# Altium footprint library TYCO THD.PcbLib: 146 footprints (part 4 of 11)
Each footprint in its own frame and in the unit in brackets; x right, y up, seen from the top. Pads: shape width x height; smd on the part's side, far side on the other; paste and mask are expansions set on the pad; w line width, h text height; cw(c..) or ccw(c..) is an arc to the next point about the centre after c.
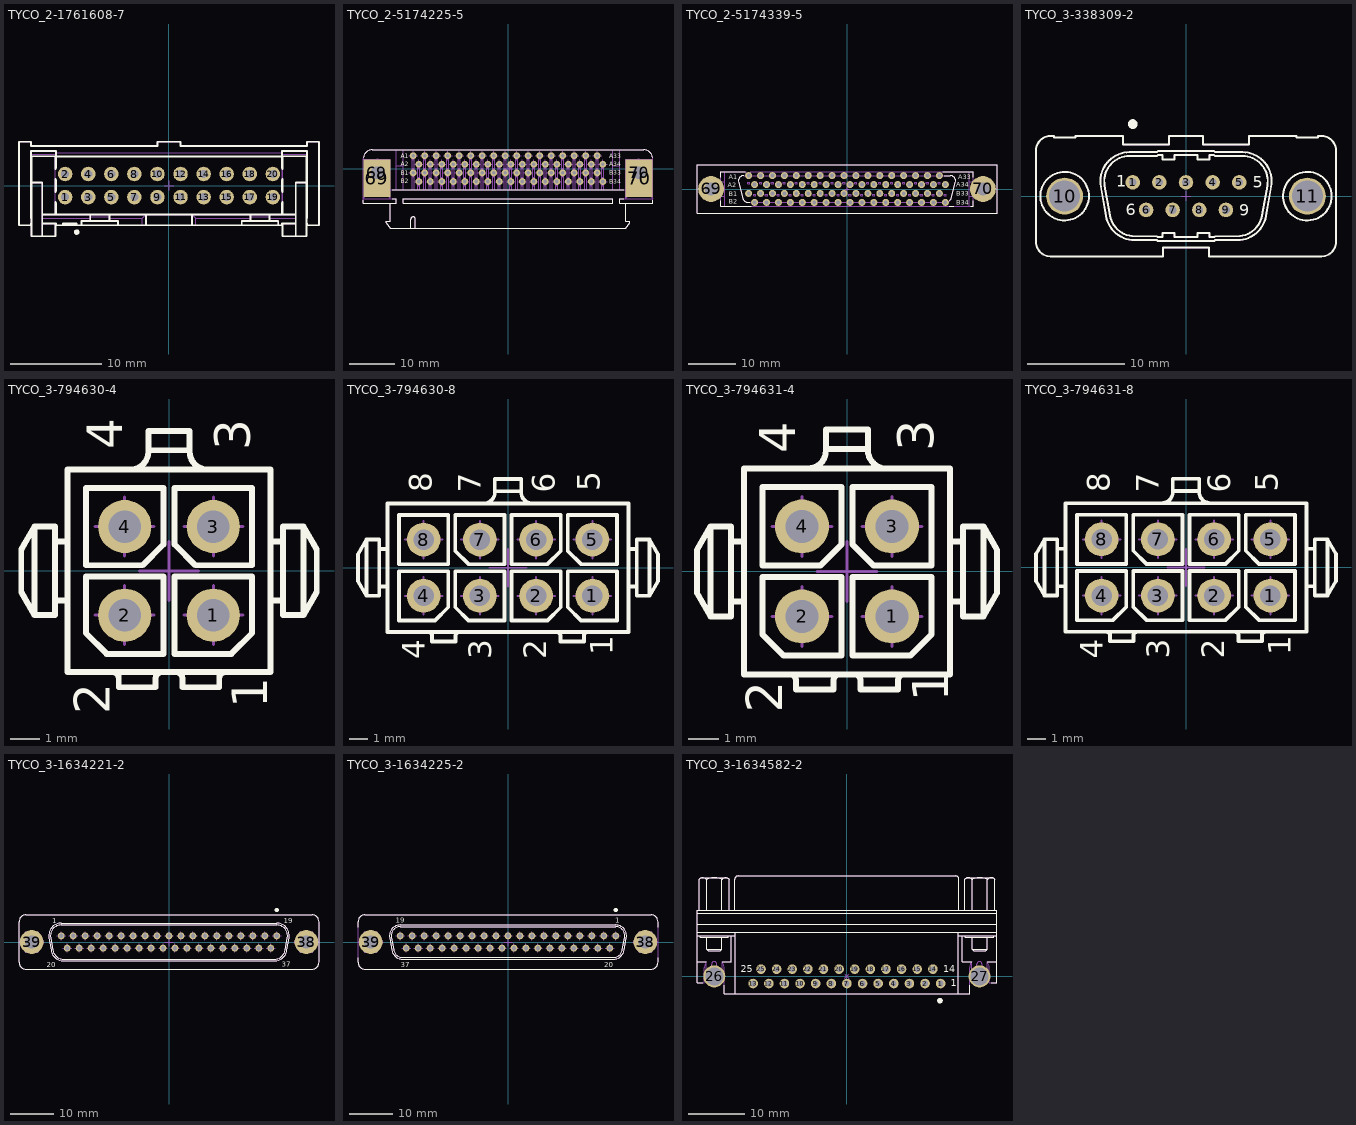
[diagram p3: the footprints below, top view; thin cyan lines are the x and y axes]

## TYCO_2-1761608-7 [mm] "34 Contacts, Vertical Low Profile IDC Shrouded Header, with Short Eject Latch"
height 18.79
pads (20):
  round 1.6 hole 0.9: 1(-11.43,-1.27) 2(-11.43,1.27) 3(-8.89,-1.27) 4(-8.89,1.27) 5(-6.35,-1.27) 6(-6.35,1.27) 7(-3.81,-1.27) 8(-3.81,1.27) 9(-1.27,-1.27) 10(-1.27,1.27) 11(1.27,-1.27) 12(1.27,1.27) 13(3.81,-1.27) 14(3.81,1.27) 15(6.35,-1.27) 16(6.35,1.27) 17(8.89,-1.27) 18(8.89,1.27) 19(11.43,-1.27) 20(11.43,1.27)
Top Overlay:
  circle w0.3: c-10.155,-5.125 r0.15
  lines w0.2: -15.138,-4.191 -15.189,-4.191 -15.189,-4.369 -16.51,-4.369 -16.51,4.826 -15.189,4.826 -15.189,4.369 -1.27,4.369 -1.27,4.826 1.27,4.826 1.27,4.369 15.189,4.369 15.189,4.826 16.51,4.826 16.51,-4.369 15.189,-4.369 15.189,-4.191 15.139,-4.191 ; -15.138,-3.581 -15.189,-3.581 -15.189,3.81 -12.446,3.81 -12.446,1.909 ; -15.138,0.33 -13.944,0.33 -13.944,-5.565 ; -13.944,-4.191 -12.446,-4.191 -12.446,-4.369 -3.81,-4.369 3.81,-4.369 12.446,-4.369 12.446,-4.191 13.945,-4.191 ; -13.944,-3.2 -3.81,-3.2 3.81,-3.2 13.945,-3.2 ; -12.497,-4.191 -12.497,-5.588 -15.138,-5.588 -15.138,3.226 -12.497,3.226 -12.497,1.819 ; -12.497,-3.2 -12.497,-1.819 ; -12.497,-0.721 -12.497,0.721 ; -12.497,3.2 -3.81,3.2 3.81,3.2 12.497,3.2 ; -12.446,-3.2 -12.446,-1.909 ; -12.446,-0.631 -12.446,0.631 ; -11.684,-4.369 -11.684,-4.191 -10.16,-4.191 -10.16,-4.369 ; -10.922,-4.369 -10.922,-4.191 ; -9.626,-4.369 -9.626,-3.886 -5.613,-3.886 -5.613,-4.369 ; -8.674,-3.886 -8.674,-3.2 ; -6.566,-3.886 -6.566,-3.2 ; -2.54,-4.369 -2.54,-3.2 ; 2.54,-4.369 2.54,-3.2 ; 8.014,-4.369 8.014,-3.886 12.027,-3.886 12.027,-4.369 ; 8.966,-3.886 8.966,-3.2 ; 11.075,-3.886 11.075,-3.2 ; 12.446,-3.2 12.446,-1.909 ; 12.446,-0.631 12.446,0.631 ; 12.446,1.909 12.446,3.81 15.189,3.81 15.189,-3.581 15.139,-3.581 ; 12.497,-4.191 12.497,-5.588 15.139,-5.588 15.139,3.226 12.497,3.226 12.497,1.819 ; 12.497,-3.2 12.497,-1.819 ; 12.497,-0.721 12.497,0.721 ; 13.945,-5.565 13.945,0.33 15.139,0.33
Mechanical 8:
  lines w0.1: -11.93,-1.27 -11.43,-1.27 ; -11.93,1.27 -11.43,1.27 ; -11.43,-1.77 -11.43,-1.27 ; -11.43,-0.77 -11.43,-1.27 ; -11.43,0.77 -11.43,1.27 ; -11.43,1.77 -11.43,1.27 ; -10.93,-1.27 -11.43,-1.27 ; -10.93,1.27 -11.43,1.27 ; -9.39,-1.27 -8.89,-1.27 ; -9.39,1.27 -8.89,1.27 ; -8.89,-1.77 -8.89,-1.27 ; -8.89,-0.77 -8.89,-1.27 ; -8.89,0.77 -8.89,1.27 ; -8.89,1.77 -8.89,1.27 ; -8.39,-1.27 -8.89,-1.27 ; -8.39,1.27 -8.89,1.27 ; -6.85,-1.27 -6.35,-1.27 ; -6.85,1.27 -6.35,1.27 ; -6.35,-1.77 -6.35,-1.27 ; -6.35,-0.77 -6.35,-1.27 ; -6.35,0.77 -6.35,1.27 ; -6.35,1.77 -6.35,1.27 ; -5.85,-1.27 -6.35,-1.27 ; -5.85,1.27 -6.35,1.27 ; -4.31,-1.27 -3.81,-1.27 ; -4.31,1.27 -3.81,1.27 ; -3.81,-1.77 -3.81,-1.27 ; -3.81,-0.77 -3.81,-1.27 ; -3.81,0.77 -3.81,1.27 ; -3.81,1.77 -3.81,1.27 ; -3.31,-1.27 -3.81,-1.27 ; -3.31,1.27 -3.81,1.27 ; -1.77,-1.27 -1.27,-1.27 ; -1.77,1.27 -1.27,1.27 ; -1.27,-1.77 -1.27,-1.27 ; -1.27,-0.77 -1.27,-1.27 ; -1.27,0.77 -1.27,1.27 ; -1.27,1.77 -1.27,1.27 ; -0.77,-1.27 -1.27,-1.27 ; -0.77,1.27 -1.27,1.27 ; -0.5,0 0,0 ; 0,-0.5 0,0 ; 0,0.5 0,0 ; 0.5,0 0,0 ; 0.77,-1.27 1.27,-1.27 ; 0.77,1.27 1.27,1.27 ; 1.27,-1.77 1.27,-1.27 ; 1.27,-0.77 1.27,-1.27 ; 1.27,0.77 1.27,1.27 ; 1.27,1.77 1.27,1.27 ; 1.77,-1.27 1.27,-1.27 ; 1.77,1.27 1.27,1.27 ; 3.31,-1.27 3.81,-1.27 ; 3.31,1.27 3.81,1.27 ; 3.81,-1.77 3.81,-1.27 ; 3.81,-0.77 3.81,-1.27 ; 3.81,0.77 3.81,1.27 ; 3.81,1.77 3.81,1.27 ; 4.31,-1.27 3.81,-1.27 ; 4.31,1.27 3.81,1.27 ; 5.85,-1.27 6.35,-1.27 ; 5.85,1.27 6.35,1.27 ; 6.35,-1.77 6.35,-1.27 ; 6.35,-0.77 6.35,-1.27 ; 6.35,0.77 6.35,1.27 ; 6.35,1.77 6.35,1.27 ; 6.85,-1.27 6.35,-1.27 ; 6.85,1.27 6.35,1.27 ; 8.39,-1.27 8.89,-1.27 ; 8.39,1.27 8.89,1.27 ; 8.89,-1.77 8.89,-1.27 ; 8.89,-0.77 8.89,-1.27 ; 8.89,0.77 8.89,1.27 ; 8.89,1.77 8.89,1.27 ; 9.39,-1.27 8.89,-1.27 ; 9.39,1.27 8.89,1.27 ; 10.93,-1.27 11.43,-1.27 ; 10.93,1.27 11.43,1.27 ; 11.43,-1.77 11.43,-1.27 ; 11.43,-0.77 11.43,-1.27 ; 11.43,0.77 11.43,1.27 ; 11.43,1.77 11.43,1.27 ; 11.93,-1.27 11.43,-1.27 ; 11.93,1.27 11.43,1.27
Mechanical 14:
  drawing of 157 lines, arcs and shapes, not listed
3D body "TYCO_2-1761608-7.stp": height 18.79, standoff -2.59, extent -16.51,-5.588 16.51,4.826

## TYCO_2-5174225-5 [mm] "68 contacts, AMPLIMITE .050\", Right Angled Header  Series 2 Type B (Mounting Holes 2.7mm)"
height 9.5
pads (72):
  rect 6x8.355 smd paste-3: 69(-28.955,-2.13) 70(28.955,-2.13)
  round 5.5 hole 2.8: 69(-28.955,-0.953) 70(28.955,-0.953)
  round 1.5 hole 0.8: A1(-20.955,2.858) A2(-19.685,0.953) A3(-18.415,2.858) A4(-17.145,0.953) A5(-15.875,2.858) A6(-14.605,0.953) A7(-13.335,2.858) A8(-12.065,0.952) A9(-10.795,2.858) A10(-9.525,0.953) A11(-8.255,2.858) A12(-6.985,0.953) A13(-5.715,2.858) A14(-4.445,0.953) A15(-3.175,2.858) A16(-1.905,0.953) A17(-0.635,2.858) A18(0.635,0.953) A19(1.905,2.858) A20(3.175,0.953) A21(4.445,2.858) A22(5.715,0.953) A23(6.985,2.858) A24(8.255,0.953) A25(9.525,2.858) A26(10.795,0.953) A27(12.065,2.858) A28(13.335,0.953) A29(14.605,2.858) A30(15.875,0.953) A31(17.145,2.858) A32(18.415,0.953) A33(19.685,2.858) A34(20.955,0.953) B1(-20.955,-0.953) B2(-19.685,-2.858) B3(-18.415,-0.953) B4(-17.145,-2.858) B5(-15.875,-0.953) B6(-14.605,-2.858) B7(-13.335,-0.953) B8(-12.065,-2.858) B9(-10.795,-0.953) B10(-9.525,-2.858) B11(-8.255,-0.953) B12(-6.985,-2.858) B13(-5.715,-0.953) B14(-4.445,-2.858) B15(-3.175,-0.953) B16(-1.905,-2.858) B17(-0.635,-0.953) B18(0.635,-2.858) B19(1.905,-0.953) B20(3.175,-2.858) B21(4.445,-0.953) B22(5.715,-2.858) B23(6.985,-0.953) B24(8.255,-2.858) B25(9.525,-0.953) B26(10.795,-2.858) B27(12.065,-0.953) B28(13.335,-2.858) B29(14.605,-0.953) B30(15.875,-2.858) B31(17.145,-0.953) B32(18.415,-2.858) B33(19.685,-0.953) B34(20.955,-2.858)
Top Overlay:
  lines w0.2: -31.955,-7.007 -31.955,-7.658 -24.69,-7.658 -24.69,-6.658 -25.605,-6.658 ; -31.939,2.398 cw(c-29.955,2.143) -29.955,4.143 29.955,4.143 cw(c29.955,2.143) 31.939,2.398 ; -26.055,-7.658 -26.055,-11.658 -26.855,-11.658 -26.855,-11.957 -26.055,-13.157 26.055,-13.157 26.855,-11.957 26.855,-11.658 26.055,-11.658 26.055,-7.658 ; -25.605,-4.657 25.605,-4.657 ; -21.455,-13.157 -21.455,-11.158 cw(c-20.955,-11.158) -20.455,-11.158 -20.455,-13.157 ; 25.605,-6.658 24.69,-6.658 24.69,-7.658 31.955,-7.658 31.955,-7.007 ; -23.14,-7.658 23.14,-7.658 23.14,-6.658 -23.14,-6.658 -23.14,-7.658
  text "B1" at -23.65,-1.5 h1
  text "A2" at -23.65,0.5 h1
  text "A1" at -23.65,2.25 h1
  text "B2" at -23.65,-3.25 h1
  text "A33" at 22.4,2.335 h1
  text "B34" at 22.4,-3.365 h1
  text "B33" at 22.4,-1.415 h1
  text "A34" at 22.4,0.485 h1
Mechanical 8:
  drawing of 302 lines, arcs and shapes, not listed
Mechanical 14:
  drawing of 174 lines, arcs and shapes, not listed
3D body "TYCO_2-5174225-5.stp": height 9.5, standoff -2.9, extent -31.955,-13.357 31.955,4.143

## TYCO_2-5174339-5 [mm] "68 contacts,AMPLIMITE .050 Series II Connector, Through-hole Vertical Plug"
height 9.3
pads (70):
  round 5.5 hole 2.8: 69(-28.956,0) 70(28.956,0)
  round 1.5 hole 0.8: A1(-20.955,2.858) A2(-19.685,0.953) A3(-18.415,2.858) A4(-17.145,0.953) A5(-15.875,2.858) A6(-14.605,0.953) A7(-13.335,2.858) A8(-12.065,0.952) A9(-10.795,2.858) A10(-9.525,0.953) A11(-8.255,2.858) A12(-6.985,0.953) A13(-5.715,2.858) A14(-4.445,0.953) A15(-3.175,2.858) A16(-1.905,0.953) A17(-0.635,2.858) A18(0.635,0.953) A19(1.905,2.858) A20(3.175,0.953) A21(4.445,2.858) A22(5.715,0.953) A23(6.985,2.858) A24(8.255,0.953) A25(9.525,2.858) A26(10.795,0.953) A27(12.065,2.858) A28(13.335,0.953) A29(14.605,2.858) A30(15.875,0.953) A31(17.145,2.858) A32(18.415,0.953) A33(19.685,2.858) A34(20.955,0.953) B1(-20.955,-0.953) B2(-19.685,-2.858) B3(-18.415,-0.953) B4(-17.145,-2.858) B5(-15.875,-0.953) B6(-14.605,-2.858) B7(-13.335,-0.953) B8(-12.065,-2.858) B9(-10.795,-0.953) B10(-9.525,-2.858) B11(-8.255,-0.953) B12(-6.985,-2.858) B13(-5.715,-0.953) B14(-4.445,-2.858) B15(-3.175,-0.953) B16(-1.905,-2.858) B17(-0.635,-0.953) B18(0.635,-2.858) B19(1.905,-0.953) B20(3.175,-2.858) B21(4.445,-0.953) B22(5.715,-2.858) B23(6.985,-0.953) B24(8.255,-2.858) B25(9.525,-0.953) B26(10.795,-2.858) B27(12.065,-0.953) B28(13.335,-2.858) B29(14.605,-0.953) B30(15.875,-2.858) B31(17.145,-0.953) B32(18.415,-2.858) B33(19.685,-0.953) B34(20.955,-2.858)
Top Overlay:
  lines w0.2: -26.855,-2.475 -26.855,-3.65 -20.365,-3.65 ; -26.855,2.475 -26.855,3.65 -21.635,3.65 ; -22.005,2.85 -22.04,2.85 ccw(c-22.04,1.75) -23.103,1.465 -22.165,-2.035 ccw(c-21.102,-1.75) -21.102,-2.85 -20.735,-2.85 ; 20.365,3.65 26.855,3.65 26.855,2.475 ; 20.735,2.85 22.04,2.85 cw(c22.04,1.75) 23.103,1.465 22.165,-2.035 cw(c21.102,-1.75) 21.932,-2.472 ; 21.825,-3.65 22.7,-3.65 ; 26.325,-3.65 26.855,-3.65 26.855,-2.475 ; -31.955,-5.15 -31.955,5.15 31.955,5.15 31.955,-5.15 -31.955,-5.15
  text "A34" at 23.24,0.502 h1
  text "B33" at 23.24,-1.398 h1
  text "B34" at 23.24,-3.348 h1
  text "A33" at 23.725,2.125 h1
  text "B2" at -25.22,-3.183 h1
  text "A1" at -25.22,2.067 h1
  text "A2" at -25.42,0.367 h1
  text "B1" at -25.22,-1.508 h1
Mechanical 8:
  drawing of 284 lines, arcs and shapes, not listed
Mechanical 14:
  drawing of 302 lines, arcs and shapes, not listed
  text "A34" at 23.24,0.502 h1.02
  text "B33" at 23.24,-1.398 h1.02
  text "B34" at 23.24,-3.348 h1.02
  text "A33" at 23.725,2.125 h1.02
  text "B2" at -25.22,-3.183 h1.02
  text "A1" at -25.22,2.067 h1.02
  text "A2" at -25.42,0.367 h1.02
  text "B1" at -25.22,-1.508 h1.02
3D body "TYCO_2-5174339-5.stp": height 9.3, standoff -3.1, extent -31.955,-5.15 31.955,5.15

## TYCO_3-338309-2 [mm] "Straight D-SUB 9 Male Contacts, Shell Size 1, With Board Lock and Female Screwlocks with Tread 4-40 UNC, HDP-20 Series"
height 11.7
pads (11):
  round 1.5 hole 0.8: 1(-5.486,1.423) 2(-2.743,1.423) 3(0,1.423) 4(2.743,1.423) 5(5.486,1.423) 6(-4.114,-1.423) 7(-1.371,-1.423) 8(1.372,-1.423) 9(4.115,-1.423)
  round 3.8 hole 3.2: 10(-12.495,0) 11(12.495,0)
Top Overlay:
  circle w0.2: c-12.495,0 r2.5
  circle w0.2: c12.495,0 r2.5
  circle w0.5: c-5.48,7.42 r0.25
  lines w0.2: -8.774,1.009 cw(c-5.82,1.53) -5.82,4.53 ; -8.774,1.009 cw(c-5.82,1.53) -5.82,4.53 ; -8.774,1.009 -8.235,-2.051 ; -8.774,1.009 -8.235,-2.051 ; -8.381,1.079 cw(c-5.82,1.53) -5.82,4.13 ; -8.381,1.079 cw(c-5.82,1.53) -5.82,4.13 ; -8.381,1.079 -7.841,-1.981 ; -8.381,1.079 -7.841,-1.981 ; -8.235,-2.051 ccw(c-5.28,-1.53) -5.28,-4.53 ; -8.235,-2.051 ccw(c-5.28,-1.53) -5.28,-4.53 ; -7.841,-1.981 ccw(c-5.28,-1.53) -5.28,-4.13 ; -7.841,-1.981 ccw(c-5.28,-1.53) -5.28,-4.13 ; -5.82,4.13 -3,4.13 ; -5.82,4.13 -3,4.13 ; -5.82,4.53 -3,4.53 ; -5.82,4.53 -3,4.53 ; -5.28,-4.53 -3,-4.53 ; -5.28,-4.53 -3,-4.53 ; -5.28,-4.13 -3,-4.13 ; -5.28,-4.13 -3,-4.13 ; -3,-4.53 -2.9,-4.63 ; -3,-4.53 -2.9,-4.63 ; -3,-4.13 -2.9,-4.23 ; -3,-4.13 -2.9,-4.23 ; -3,4.13 -2.9,4.23 ; -3,4.13 -2.9,4.23 ; -3,4.53 -2.9,4.63 ; -3,4.53 -2.9,4.63 ; -2.9,-4.63 2.9,-4.63 ; -2.9,-4.63 2.9,-4.63 ; -2.9,-4.23 -2.4,-4.23 ; -2.9,-4.23 -2.4,-4.23 ; -2.9,4.23 -2.4,4.23 ; -2.9,4.23 -2.4,4.23 ; -2.9,4.63 2.9,4.63 ; -2.9,4.63 2.9,4.63 ; -2.4,-4.23 -2.4,-3.775 ; -2.4,-4.23 -2.4,-3.775 ; -2.4,-3.775 -1.2,-3.775 ; -2.4,-3.775 -1.2,-3.775 ; -2.4,3.775 -1.2,3.775 ; -2.4,3.775 -2.4,4.23 ; -2.4,3.775 -1.2,3.775 ; -2.4,3.775 -2.4,4.23 ; -1.2,-4.23 -1.2,-3.775 ; -1.2,-4.23 1.2,-4.23 ; -1.2,-4.23 -1.2,-3.775 ; -1.2,-4.23 1.2,-4.23 ; -1.2,3.775 -1.2,4.23 ; -1.2,3.775 -1.2,4.23 ; -1.2,4.23 1.2,4.23 ; -1.2,4.23 1.2,4.23 ; 1.2,-4.23 1.2,-3.775 ; 1.2,-4.23 1.2,-3.775 ; 1.2,-3.775 2.4,-3.775 ; 1.2,-3.775 2.4,-3.775 ; 1.2,3.775 2.4,3.775 ; 1.2,3.775 1.2,4.23 ; 1.2,3.775 2.4,3.775 ; 1.2,3.775 1.2,4.23 ; 2.4,-4.23 2.4,-3.775 ; 2.4,-4.23 2.9,-4.23 ; 2.4,-4.23 2.4,-3.775 ; 2.4,-4.23 2.9,-4.23 ; 2.4,3.775 2.4,4.23 ; 2.4,3.775 2.4,4.23 ; 2.4,4.23 2.9,4.23 ; 2.4,4.23 2.9,4.23 ; 2.9,-4.63 3,-4.53 ; 2.9,-4.63 3,-4.53 ; 2.9,-4.23 3,-4.13 ; 2.9,-4.23 3,-4.13 ; 2.9,4.23 3,4.13 ; 2.9,4.23 3,4.13 ; 2.9,4.63 3,4.53 ; 2.9,4.63 3,4.53 ; 3,-4.53 5.28,-4.53 ; 3,-4.53 5.28,-4.53 ; 3,-4.13 5.28,-4.13 ; 3,-4.13 5.28,-4.13 ; 3,4.13 5.82,4.13 ; 3,4.13 5.82,4.13 ; 3,4.53 5.82,4.53 ; 3,4.53 5.82,4.53 ; 5.28,-4.53 ccw(c5.28,-1.53) 8.235,-2.051 ; 5.28,-4.53 ccw(c5.28,-1.53) 8.235,-2.051 ; 5.28,-4.13 ccw(c5.28,-1.53) 7.841,-1.981 ; 5.28,-4.13 ccw(c5.28,-1.53) 7.841,-1.981 ; 5.82,4.13 cw(c5.82,1.53) 8.381,1.079 ; 5.82,4.13 cw(c5.82,1.53) 8.381,1.079 ; 5.82,4.53 cw(c5.82,1.53) 8.774,1.009 ; 5.82,4.53 cw(c5.82,1.53) 8.774,1.009 ; 7.841,-1.981 8.381,1.079 ; 7.841,-1.981 8.381,1.079 ; 8.235,-2.051 8.774,1.009 ; 8.235,-2.051 8.774,1.009 ; -15.445,-4.7 ccw(c-13.945,-4.7) -13.945,-6.2 -2.375,-6.2 -2.375,-5.3 2.375,-5.3 2.375,-6.2 13.945,-6.2 ccw(c13.945,-4.7) 15.445,-4.7 15.445,4.7 ccw(c13.945,4.7) 13.945,6.2 13.595,6.2 13.595,6.05 11.395,6.05 11.395,6.2 6.485,6.2 6.485,5.3 1.735,5.3 1.735,6.2 -1.735,6.2 -1.735,5.3 -6.485,5.3 -6.485,6.2 -11.395,6.2 -11.395,6.05 -13.595,6.05 -13.595,6.2 -13.945,6.2 ccw(c-13.945,4.7) -15.445,4.7 -15.445,-4.7
  text "6" at -6.21,-1.97 h1.2
  text "5" at 6.855,0.87 h1.2
  text "1" at -7.18,0.945 h1.2
  text "9" at 5.485,-2.02 h1.2
Mechanical 8:
  lines w0.1: -13,0 -12.5,0 ; -12.5,-0.5 -12.5,0 ; -12.5,0.5 -12.5,0 ; -12,0 -12.5,0 ; -5.98,1.42 -5.48,1.42 ; -5.48,0.92 -5.48,1.42 ; -5.48,1.92 -5.48,1.42 ; -4.98,1.42 -5.48,1.42 ; -4.61,-1.42 -4.11,-1.42 ; -4.11,-1.92 -4.11,-1.42 ; -4.11,-0.92 -4.11,-1.42 ; -3.61,-1.42 -4.11,-1.42 ; -3.24,1.42 -2.74,1.42 ; -2.74,0.92 -2.74,1.42 ; -2.74,1.92 -2.74,1.42 ; -2.24,1.42 -2.74,1.42 ; -1.87,-1.42 -1.37,-1.42 ; -1.37,-1.92 -1.37,-1.42 ; -1.37,-0.92 -1.37,-1.42 ; -0.87,-1.42 -1.37,-1.42 ; -0.5,0 0,0 ; -0.5,1.42 0,1.42 ; 0,-0.5 0,0 ; 0,0.5 0,0 ; 0,0.92 0,1.42 ; 0,1.92 0,1.42 ; 0.5,0 0,0 ; 0.5,1.42 0,1.42 ; 0.87,-1.42 1.37,-1.42 ; 1.37,-1.92 1.37,-1.42 ; 1.37,-0.92 1.37,-1.42 ; 1.87,-1.42 1.37,-1.42 ; 2.24,1.42 2.74,1.42 ; 2.74,0.92 2.74,1.42 ; 2.74,1.92 2.74,1.42 ; 3.24,1.42 2.74,1.42 ; 3.61,-1.42 4.11,-1.42 ; 4.11,-1.92 4.11,-1.42 ; 4.11,-0.92 4.11,-1.42 ; 4.61,-1.42 4.11,-1.42 ; 4.98,1.42 5.48,1.42 ; 5.48,0.92 5.48,1.42 ; 5.48,1.92 5.48,1.42 ; 5.98,1.42 5.48,1.42 ; 12,0 12.5,0 ; 12.5,-0.5 12.5,0 ; 12.5,0.5 12.5,0 ; 13,0 12.5,0
Mechanical 14:
  circle w0.1: c-12.495,0 r2.5
  circle w0.1: c-12.495,0 r1.13
  circle w0.1: c12.495,0 r1.13
  circle w0.1: c12.495,0 r2.5
  circle w0.1: c-5.486,1.422 r0.51
  circle w0.1: c-2.74,1.42 r0.51
  circle w0.1: c0,1.42 r0.51
  circle w0.1: c-4.11,-1.42 r0.51
  circle w0.1: c-1.37,-1.42 r0.51
  circle w0.1: c1.37,-1.42 r0.51
  circle w0.1: c2.74,1.42 r0.51
  circle w0.1: c5.48,1.42 r0.51
  circle w0.1: c4.11,-1.42 r0.51
  lines w0.1: -8.774,1.009 cw(c-5.82,1.53) -5.82,4.53 ; -8.774,1.009 cw(c-5.82,1.53) -5.82,4.53 ; -8.774,1.009 -8.235,-2.051 ; -8.774,1.009 -8.235,-2.051 ; -8.381,1.079 cw(c-5.82,1.53) -5.82,4.13 ; -8.381,1.079 cw(c-5.82,1.53) -5.82,4.13 ; -8.381,1.079 -7.841,-1.981 ; -8.381,1.079 -7.841,-1.981 ; -8.235,-2.051 ccw(c-5.28,-1.53) -5.28,-4.53 ; -8.235,-2.051 ccw(c-5.28,-1.53) -5.28,-4.53 ; -7.841,-1.981 ccw(c-5.28,-1.53) -5.28,-4.13 ; -7.841,-1.981 ccw(c-5.28,-1.53) -5.28,-4.13 ; -5.82,4.13 -3,4.13 ; -5.82,4.13 -3,4.13 ; -5.82,4.53 -3,4.53 ; -5.82,4.53 -3,4.53 ; -5.28,-4.53 -3,-4.53 ; -5.28,-4.53 -3,-4.53 ; -5.28,-4.13 -3,-4.13 ; -5.28,-4.13 -3,-4.13 ; -3,-4.53 -2.9,-4.63 ; -3,-4.53 -2.9,-4.63 ; -3,-4.13 -2.9,-4.23 ; -3,-4.13 -2.9,-4.23 ; -3,4.13 -2.9,4.23 ; -3,4.13 -2.9,4.23 ; -3,4.53 -2.9,4.63 ; -3,4.53 -2.9,4.63 ; -2.9,-4.63 2.9,-4.63 ; -2.9,-4.63 2.9,-4.63 ; -2.9,-4.23 -2.4,-4.23 ; -2.9,-4.23 -2.4,-4.23 ; -2.9,4.23 -2.4,4.23 ; -2.9,4.23 -2.4,4.23 ; -2.9,4.63 2.9,4.63 ; -2.9,4.63 2.9,4.63 ; -2.4,-4.23 -2.4,-3.775 ; -2.4,-4.23 -2.4,-3.775 ; -2.4,-3.775 -1.2,-3.775 ; -2.4,-3.775 -1.2,-3.775 ; -2.4,3.775 -1.2,3.775 ; -2.4,3.775 -2.4,4.23 ; -2.4,3.775 -2.4,4.23 ; -2.4,3.775 -1.2,3.775 ; -1.2,-4.23 -1.2,-3.775 ; -1.2,-4.23 1.2,-4.23 ; -1.2,-4.23 1.2,-4.23 ; -1.2,-4.23 -1.2,-3.775 ; -1.2,3.775 -1.2,4.23 ; -1.2,3.775 -1.2,4.23 ; -1.2,4.23 1.2,4.23 ; -1.2,4.23 1.2,4.23 ; 1.2,-4.23 1.2,-3.775 ; 1.2,-4.23 1.2,-3.775 ; 1.2,-3.775 2.4,-3.775 ; 1.2,-3.775 2.4,-3.775 ; 1.2,3.775 2.4,3.775 ; 1.2,3.775 1.2,4.23 ; 1.2,3.775 1.2,4.23 ; 1.2,3.775 2.4,3.775 ; 2.4,-4.23 2.4,-3.775 ; 2.4,-4.23 2.9,-4.23 ; 2.4,-4.23 2.9,-4.23 ; 2.4,-4.23 2.4,-3.775 ; 2.4,3.775 2.4,4.23 ; 2.4,3.775 2.4,4.23 ; 2.4,4.23 2.9,4.23 ; 2.4,4.23 2.9,4.23 ; 2.9,-4.63 3,-4.53 ; 2.9,-4.63 3,-4.53 ; 2.9,-4.23 3,-4.13 ; 2.9,-4.23 3,-4.13 ; 2.9,4.23 3,4.13 ; 2.9,4.23 3,4.13 ; 2.9,4.63 3,4.53 ; 2.9,4.63 3,4.53 ; 3,-4.53 5.28,-4.53 ; 3,-4.53 5.28,-4.53 ; 3,-4.13 5.28,-4.13 ; 3,-4.13 5.28,-4.13 ; 3,4.13 5.82,4.13 ; 3,4.13 5.82,4.13 ; 3,4.53 5.82,4.53 ; 3,4.53 5.82,4.53 ; 5.28,-4.53 ccw(c5.28,-1.53) 8.235,-2.051 ; 5.28,-4.53 ccw(c5.28,-1.53) 8.235,-2.051 ; 5.28,-4.13 ccw(c5.28,-1.53) 7.841,-1.981 ; 5.28,-4.13 ccw(c5.28,-1.53) 7.841,-1.981 ; 5.82,4.13 cw(c5.82,1.53) 8.381,1.079 ; 5.82,4.13 cw(c5.82,1.53) 8.381,1.079 ; 5.82,4.53 cw(c5.82,1.53) 8.774,1.009 ; 5.82,4.53 cw(c5.82,1.53) 8.774,1.009 ; 7.841,-1.981 8.381,1.079 ; 7.841,-1.981 8.381,1.079 ; 8.235,-2.051 8.774,1.009 ; 8.235,-2.051 8.774,1.009 ; -15.445,-4.7 ccw(c-13.945,-4.7) -13.945,-6.2 -2.375,-6.2 -2.375,-5.3 2.375,-5.3 2.375,-6.2 13.945,-6.2 ccw(c13.945,-4.7) 15.445,-4.7 15.445,4.7 ccw(c13.945,4.7) 13.945,6.2 13.595,6.2 13.595,6.05 11.395,6.05 11.395,6.2 6.485,6.2 6.485,5.3 1.735,5.3 1.735,6.2 -1.735,6.2 -1.735,5.3 -6.485,5.3 -6.485,6.2 -11.395,6.2 -11.395,6.05 -13.595,6.05 -13.595,6.2 -13.945,6.2 ccw(c-13.945,4.7) -15.445,4.7 -15.445,-4.7
  text "9 D-Sub Male" at -6.053,4.872 h1.2
3D body "TYCO_3-338309-2.stp": height 12.15, standoff -3.2, extent -15.445,-6.2 15.445,6.2

## TYCO_3-794630-4 [mm] "4 Circuits Dual-Row - Vertical Micro MATE-N-LOK Connector"
height 9.24
pads (4):
  round 1.8 hole 1.1: 1(1.5,-1.5) 2(-1.5,-1.5) 3(1.5,1.5) 4(-1.5,1.5)
Top Overlay:
  lines w0.2: -3.86,-1 -3.43,-1 ; -3.86,1 -3.43,1 ; -1.9,-3.43 cw(c-1.9,-3.63) -1.7,-3.63 -1.7,-3.94 -0.45,-3.94 -0.45,-3.63 cw(c-0.25,-3.63) -0.25,-3.43 ; -1.3,3.43 ccw(c-1.3,4.03) -0.7,4.03 -0.7,4.082 ; 0.25,-3.43 cw(c0.25,-3.63) 0.45,-3.63 0.45,-3.94 1.7,-3.94 1.7,-3.63 cw(c1.9,-3.63) 1.9,-3.43 ; 1.3,3.43 cw(c1.3,4.03) 0.7,4.03 0.7,4.082 ; 3.43,-1 3.86,-1 ; 3.43,1 3.86,1 ; -4.55,-1.5 -3.86,-1.5 -3.86,1.5 -4.55,1.5 ; -4.55,-1.5 -5,-0.72 -5,0.72 -4.55,1.5 ; -4.55,-1.5 -4.55,1.5 ; -0.7,4.082 -0.7,4.73 0.7,4.73 0.7,4.082 ; -0.7,4.082 0.7,4.082 ; 4.55,-1.5 3.86,-1.5 3.86,1.5 4.55,1.5 ; 4.55,-1.5 4.55,1.5 ; 4.55,-1.5 5,-0.72 5,0.72 4.55,1.5 ; -3.43,-3.43 -3.43,3.43 3.43,3.43 3.43,-3.43 -3.43,-3.43 ; -2.81,-2.11 -2.81,-0.19 -0.19,-0.19 -0.19,-2.81 -2.11,-2.81 -2.81,-2.11 ; -2.81,0.19 -0.89,0.19 -0.19,0.89 -0.19,2.81 -2.81,2.81 -2.81,0.19 ; 0.19,-2.81 2.11,-2.81 2.81,-2.11 2.81,-0.19 0.19,-0.19 0.19,-2.81 ; 0.19,0.89 0.19,2.81 2.81,2.81 2.81,0.19 0.89,0.19 0.19,0.89
  text "3" at 2.743,4.087 h1.2
  text "4" at -1.575,4.109 h1.2
  text "2" at -2.007,-4.845 h1.2
  text "1" at 3.323,-4.645 h1.2
Mechanical 8:
  lines w0.1: -2.5,-1.5 -1.5,-1.5 ; -2.5,1.5 -1.5,1.5 ; -1.5,-2.5 -1.5,-1.5 ; -1.5,-0.5 -1.5,-1.5 ; -1.5,0.5 -1.5,1.5 ; -1.5,2.5 -1.5,1.5 ; -1,0 0,0 ; -0.5,-1.5 -1.5,-1.5 ; -0.5,1.5 -1.5,1.5 ; 0,-1 0,0 ; 0,1 0,0 ; 0.5,-1.5 1.5,-1.5 ; 0.5,1.5 1.5,1.5 ; 1,0 0,0 ; 1.5,-2.5 1.5,-1.5 ; 1.5,-0.5 1.5,-1.5 ; 1.5,0.5 1.5,1.5 ; 1.5,2.5 1.5,1.5 ; 2.5,-1.5 1.5,-1.5 ; 2.5,1.5 1.5,1.5
Mechanical 14:
  lines w0.1: -3.86,-1 -3.43,-1 ; -3.86,1 -3.43,1 ; -1.9,-3.43 cw(c-1.9,-3.63) -1.7,-3.63 -1.7,-3.94 -0.45,-3.94 -0.45,-3.63 cw(c-0.25,-3.63) -0.25,-3.43 ; -1.3,3.43 ccw(c-1.3,4.03) -0.7,4.03 -0.7,4.082 ; 0.25,-3.43 cw(c0.25,-3.63) 0.45,-3.63 0.45,-3.94 1.7,-3.94 1.7,-3.63 cw(c1.9,-3.63) 1.9,-3.43 ; 1.3,3.43 cw(c1.3,4.03) 0.7,4.03 0.7,4.082 ; 3.43,-1 3.86,-1 ; 3.43,1 3.86,1 ; -4.55,-1.5 -3.86,-1.5 -3.86,1.5 -4.55,1.5 ; -4.55,-1.5 -5,-0.72 -5,0.72 -4.55,1.5 ; -4.55,-1.5 -4.55,1.5 ; -0.7,4.082 -0.7,4.73 0.7,4.73 0.7,4.082 ; -0.7,4.082 0.7,4.082 ; 4.55,-1.5 3.86,-1.5 3.86,1.5 4.55,1.5 ; 4.55,-1.5 4.55,1.5 ; 4.55,-1.5 5,-0.72 5,0.72 4.55,1.5 ; -3.43,-3.43 -3.43,3.43 3.43,3.43 3.43,-3.43 -3.43,-3.43 ; -2.81,-2.11 -2.81,-0.19 -0.19,-0.19 -0.19,-2.81 -2.11,-2.81 -2.81,-2.11 ; -2.81,0.19 -0.89,0.19 -0.19,0.89 -0.19,2.81 -2.81,2.81 -2.81,0.19 ; 0.19,-2.81 2.11,-2.81 2.81,-2.11 2.81,-0.19 0.19,-0.19 0.19,-2.81 ; 0.19,0.89 0.19,2.81 2.81,2.81 2.81,0.19 0.89,0.19 0.19,0.89
  text "3" at 2.743,4.087 h1.2
  text "4" at -1.575,4.109 h1.2
  text "2" at -2.007,-4.845 h1.2
  text "1" at 3.323,-4.645 h1.2
3D body "TYCO_3-794630-4.stp": height 9.24, standoff -3.18, extent -5,-3.94 5,4.73
